# Altium footprint library Connectors_THT.PcbLib: 103 footprints (part 5 of 11)
Each footprint in its own frame and in the unit in brackets; x right, y up, seen from the top. Pads: shape width x height; smd on the part's side, far side on the other; paste and mask are expansions set on the pad; w line width, h text height; cw(c..) or ccw(c..) is an arc to the next point about the centre after c.
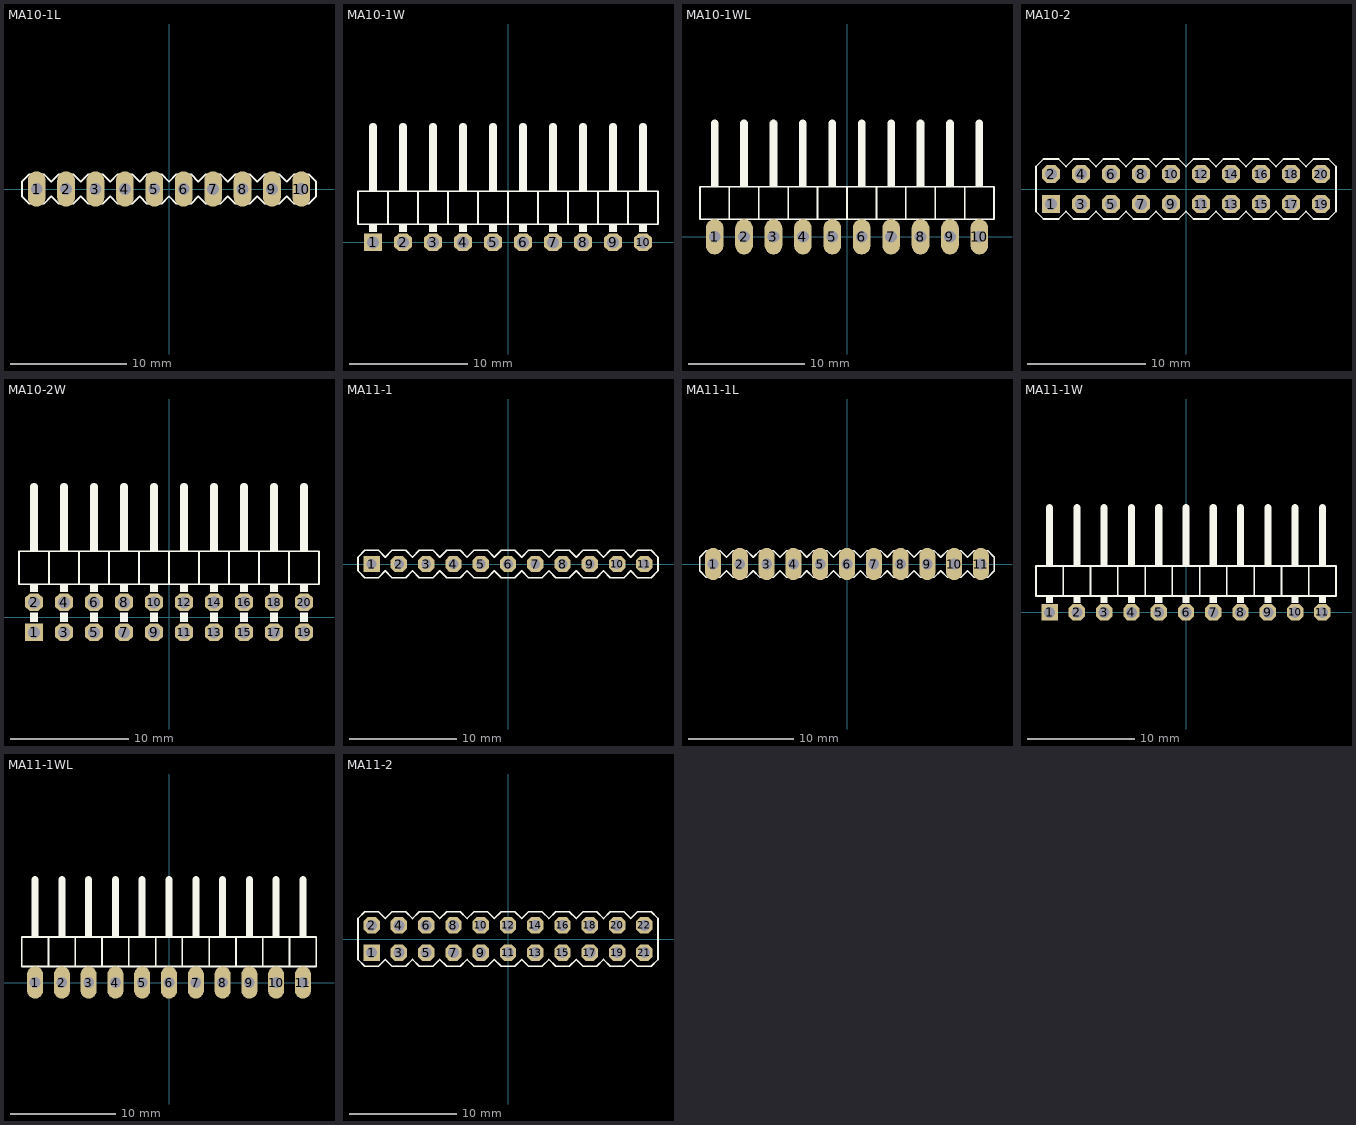
[diagram p4: the footprints below, top view; thin cyan lines are the x and y axes]

## MA10-1L [mil]
pads (10):
  oval 60x120 hole 40: 1(-450,0) 2(-350,0) 3(-250,0) 4(-150,0) 5(-50,0) 6(50,0) 7(150,0) 8(250,0) 9(350,0) 10(450,0)
Top Overlay:
  lines w6: -500,-25 -500,25 -475,50 -425,50 -400,25 -375,50 -325,50 -300,25 -275,50 -225,50 -200,25 -175,50 -125,50 -100,25 -75,50 -25,50 0,25 25,50 75,50 100,25 125,50 175,50 200,25 225,50 275,50 300,25 325,50 375,50 400,25 425,50 475,50 500,25 500,-25 475,-50 425,-50 400,-25 375,-50 325,-50 300,-25 275,-50 225,-50 200,-25 175,-50 125,-50 100,-25 75,-50 25,-50 0,-25 -25,-50 -75,-50 -100,-25 -125,-50 -175,-50 -200,-25 -225,-50 -275,-50 -300,-25 -325,-50 -375,-50 -400,-25 -425,-50 -475,-50 -500,-25
3D body: height 338.58, standoff 0, extent 437.51,-12.49 462.51,12.51
3D body: height 98.43, standoff 11.81, extent 400,-50 500,50
3D body: height 11.81, standoff 0, extent 400,-50 500,-25
3D body: height 11.81, standoff 0, extent 400,25 500,50
3D body: height 31.5, standoff 0, extent 437.5,-12.5 462.5,12.5
3D body: height 338.58, standoff 0, extent 337.51,-12.49 362.51,12.51
3D body: height 98.43, standoff 11.81, extent 300,-50 400,50
3D body: height 11.81, standoff 0, extent 300,-50 400,-25
3D body: height 11.81, standoff 0, extent 300,25 400,50
3D body: height 31.5, standoff 0, extent 337.5,-12.5 362.5,12.5
3D body: height 338.58, standoff 0, extent 237.51,-12.49 262.51,12.51
3D body: height 98.43, standoff 11.81, extent 200,-50 300,50
3D body: height 11.81, standoff 0, extent 200,-50 300,-25
3D body: height 11.81, standoff 0, extent 200,25 300,50
3D body: height 31.5, standoff 0, extent 237.5,-12.5 262.5,12.5
3D body: height 338.58, standoff 0, extent 137.51,-12.49 162.51,12.51
3D body: height 98.43, standoff 11.81, extent 100,-50 200,50
3D body: height 11.81, standoff 0, extent 100,-50 200,-25
3D body: height 11.81, standoff 0, extent 100,25 200,50
3D body: height 31.5, standoff 0, extent 137.5,-12.5 162.5,12.5
3D body: height 338.58, standoff 0, extent 37.51,-12.49 62.51,12.51
3D body: height 98.43, standoff 11.81, extent 0,-50 100,50
3D body: height 11.81, standoff 0, extent 0,-50 100,-25
3D body: height 11.81, standoff 0, extent 0,25 100,50
3D body: height 31.5, standoff 0, extent 37.5,-12.5 62.5,12.5
3D body: height 338.58, standoff 0, extent -62.49,-12.49 -37.49,12.51
3D body: height 98.43, standoff 11.81, extent -100,-50 0,50
3D body: height 11.81, standoff 0, extent -100,-50 0,-25
3D body: height 11.81, standoff 0, extent -100,25 0,50
3D body: height 31.5, standoff 0, extent -62.5,-12.5 -37.5,12.5
3D body: height 338.58, standoff 0, extent -162.49,-12.49 -137.49,12.51
3D body: height 98.43, standoff 11.81, extent -200,-50 -100,50
3D body: height 11.81, standoff 0, extent -200,-50 -100,-25
3D body: height 11.81, standoff 0, extent -200,25 -100,50
3D body: height 31.5, standoff 0, extent -162.5,-12.5 -137.5,12.5
3D body: height 338.58, standoff 0, extent -262.49,-12.49 -237.49,12.51
3D body: height 98.43, standoff 11.81, extent -300,-50 -200,50
3D body: height 11.81, standoff 0, extent -300,-50 -200,-25
3D body: height 11.81, standoff 0, extent -300,25 -200,50
3D body: height 31.5, standoff 0, extent -262.5,-12.5 -237.5,12.5
3D body: height 338.58, standoff 0, extent -362.49,-12.49 -337.49,12.51
3D body: height 98.43, standoff 11.81, extent -400,-50 -300,50
3D body: height 11.81, standoff 0, extent -400,-50 -300,-25
3D body: height 11.81, standoff 0, extent -400,25 -300,50
3D body: height 31.5, standoff 0, extent -362.5,-12.5 -337.5,12.5
3D body: height 338.58, standoff 0, extent -462.49,-12.49 -437.49,12.51
3D body: height 98.43, standoff 11.81, extent -500,-50 -400,50
3D body: height 11.81, standoff 0, extent -500,-50 -400,-25
3D body: height 11.81, standoff 0, extent -500,25 -400,50
3D body: height 31.5, standoff 0, extent -462.5,-12.5 -437.5,12.5

## MA10-1W [mil]
pads (10):
  rect 60x60 hole 40: 1(-450,0)
  oct 60x60 hole 40: 2(-350,0) 3(-250,0) 4(-150,0) 5(-50,0) 6(50,0) 7(150,0) 8(250,0) 9(350,0) 10(450,0)
Top Overlay:
  rectangle: -463,34 -437,60
  rectangle: -363,34 -337,60
  rectangle: -263,34 -237,60
  rectangle: -163,34 -137,60
  rectangle: -63,34 -37,60
  rectangle: 37,34 63,60
  rectangle: 137,34 163,60
  rectangle: 237,34 263,60
  rectangle: 337,34 363,60
  rectangle: 437,34 463,60
  rectangle: -63,170 -37,200
  rectangle: -163,170 -137,200
  rectangle: -263,170 -237,200
  rectangle: -363,170 -337,200
  rectangle: -463,170 -437,200
  rectangle: 437,170 463,200
  rectangle: 337,170 363,200
  rectangle: 237,170 263,200
  rectangle: 137,170 163,200
  rectangle: 37,170 63,200
  lines w6: -400,60 -300,60 ; -400,60 -500,60 -500,170 -400,170 ; -400,60 -400,170 ; -400,170 -300,170 ; -300,60 -300,170 ; -300,60 -200,60 ; -300,170 -200,170 ; -200,60 -200,170 ; -200,60 -100,60 ; -200,170 -100,170 ; -100,60 -100,170 ; -100,60 0,60 ; -100,170 0,170 ; 0,60 0,170 ; 0,60 100,60 ; 0,170 100,170 ; 100,60 200,60 ; 100,60 100,170 ; 100,170 200,170 ; 200,60 200,170 ; 200,60 300,60 ; 200,170 300,170 ; 300,60 300,170 ; 300,60 400,60 ; 300,170 400,170 ; 400,60 400,170 ; 400,60 500,60 500,170 400,170
  lines w26: -450,200 -450,385 ; -350,200 -350,385 ; -250,200 -250,385 ; -150,200 -150,385 ; -50,200 -50,385 ; 50,200 50,385 ; 150,200 150,385 ; 250,200 250,385 ; 350,200 350,385 ; 450,200 450,385
3D body: height 62.48, standoff 0, extent 437.51,-12.49 462.51,12.51
3D body: height 100, standoff 0, extent 400,60 500,170
3D body: height 62.5, standoff 37.5, extent 437.51,-12.49 462.51,393.76
3D body: height 62.48, standoff 0, extent 337.51,-12.49 362.51,12.51
3D body: height 100, standoff 0, extent 300,60 400,170
3D body: height 62.5, standoff 37.5, extent 337.51,-12.49 362.51,393.76
3D body: height 62.48, standoff 0, extent 237.51,-12.49 262.51,12.51
3D body: height 100, standoff 0, extent 200,60 300,170
3D body: height 62.5, standoff 37.5, extent 237.51,-12.49 262.51,393.76
3D body: height 62.48, standoff 0, extent 137.51,-12.49 162.51,12.51
3D body: height 100, standoff 0, extent 100,60 200,170
3D body: height 62.5, standoff 37.5, extent 137.51,-12.49 162.51,393.76
3D body: height 62.5, standoff 37.5, extent 37.5,-12.49 62.5,393.75
3D body: height 100, standoff 0, extent 0,60 100,170
3D body: height 62.48, standoff 0, extent 37.51,-12.49 62.51,12.51
3D body: height 31.5, standoff 0, extent 37.51,-12.49 62.51,12.51
3D body: height 31.5, standoff 0, extent 137.51,-12.49 162.51,12.51
3D body: height 31.5, standoff 0, extent 237.51,-12.49 262.51,12.51
3D body: height 31.5, standoff 0, extent 337.51,-12.49 362.51,12.51
3D body: height 31.5, standoff 0, extent 437.51,-12.49 462.51,12.51
3D body: height 62.48, standoff 0, extent -62.49,-12.49 -37.49,12.51
3D body: height 100, standoff 0, extent -100,60 0,170
3D body: height 62.5, standoff 37.5, extent -62.49,-12.49 -37.49,393.76
3D body: height 62.48, standoff 0, extent -162.49,-12.49 -137.49,12.51
3D body: height 100, standoff 0, extent -200,60 -100,170
3D body: height 62.5, standoff 37.5, extent -162.49,-12.49 -137.49,393.76
3D body: height 62.48, standoff 0, extent -262.49,-12.49 -237.49,12.51
3D body: height 100, standoff 0, extent -300,60 -200,170
3D body: height 62.5, standoff 37.5, extent -262.49,-12.49 -237.49,393.76
3D body: height 62.48, standoff 0, extent -362.49,-12.49 -337.49,12.51
3D body: height 100, standoff 0, extent -400,60 -300,170
3D body: height 62.5, standoff 37.5, extent -362.49,-12.49 -337.49,393.76
3D body: height 62.5, standoff 37.5, extent -462.5,-12.49 -437.5,393.75
3D body: height 100, standoff 0, extent -500,60 -400,170
3D body: height 62.48, standoff 0, extent -462.49,-12.49 -437.49,12.51
3D body: height 31.5, standoff 0, extent -462.49,-12.49 -437.49,12.51
3D body: height 31.5, standoff 0, extent -362.49,-12.49 -337.49,12.51
3D body: height 31.5, standoff 0, extent -262.49,-12.49 -237.49,12.51
3D body: height 31.5, standoff 0, extent -162.49,-12.49 -137.49,12.51
3D body: height 31.5, standoff 0, extent -62.49,-12.49 -37.49,12.51

## MA10-1WL [mil]
pads (10):
  oval 60x120 hole 40: 1(-450,0) 2(-350,0) 3(-250,0) 4(-150,0) 5(-50,0) 6(50,0) 7(150,0) 8(250,0) 9(350,0) 10(450,0)
Top Overlay:
  rectangle: -463,34 -437,60
  rectangle: -363,34 -337,60
  rectangle: -263,34 -237,60
  rectangle: -163,34 -137,60
  rectangle: -63,34 -37,60
  rectangle: 37,34 63,60
  rectangle: 137,34 163,60
  rectangle: 237,34 263,60
  rectangle: 337,34 363,60
  rectangle: 437,34 463,60
  rectangle: -63,170 -37,200
  rectangle: -163,170 -137,200
  rectangle: -263,170 -237,200
  rectangle: -363,170 -337,200
  rectangle: -463,170 -437,200
  rectangle: 437,170 463,200
  rectangle: 337,170 363,200
  rectangle: 237,170 263,200
  rectangle: 137,170 163,200
  rectangle: 37,170 63,200
  lines w6: -400,60 -300,60 ; -400,60 -500,60 -500,170 -400,170 ; -400,60 -400,170 ; -400,170 -300,170 ; -300,60 -300,170 ; -300,60 -200,60 ; -300,170 -200,170 ; -200,60 -200,170 ; -200,60 -100,60 ; -200,170 -100,170 ; -100,60 -100,170 ; -100,60 0,60 ; -100,170 0,170 ; 0,60 0,170 ; 0,60 100,60 ; 0,170 100,170 ; 100,60 200,60 ; 100,60 100,170 ; 100,170 200,170 ; 200,60 200,170 ; 200,60 300,60 ; 200,170 300,170 ; 300,60 300,170 ; 300,60 400,60 ; 300,170 400,170 ; 400,60 400,170 ; 400,60 500,60 500,170 400,170
  lines w26: -450,200 -450,385 ; -350,200 -350,385 ; -250,200 -250,385 ; -150,200 -150,385 ; -50,200 -50,385 ; 50,200 50,385 ; 150,200 150,385 ; 250,200 250,385 ; 350,200 350,385 ; 450,200 450,385
3D body: height 62.48, standoff 0, extent 437.51,-12.49 462.51,12.51
3D body: height 100, standoff 0, extent 400,60 500,170
3D body: height 62.5, standoff 37.5, extent 437.51,-12.49 462.51,393.76
3D body: height 62.48, standoff 0, extent 337.51,-12.49 362.51,12.51
3D body: height 100, standoff 0, extent 300,60 400,170
3D body: height 62.5, standoff 37.5, extent 337.51,-12.49 362.51,393.76
3D body: height 62.48, standoff 0, extent 237.51,-12.49 262.51,12.51
3D body: height 100, standoff 0, extent 200,60 300,170
3D body: height 62.5, standoff 37.5, extent 237.51,-12.49 262.51,393.76
3D body: height 62.48, standoff 0, extent 137.51,-12.49 162.51,12.51
3D body: height 100, standoff 0, extent 100,60 200,170
3D body: height 62.5, standoff 37.5, extent 137.51,-12.49 162.51,393.76
3D body: height 62.5, standoff 37.5, extent 37.5,-12.49 62.5,393.75
3D body: height 100, standoff 0, extent 0,60 100,170
3D body: height 62.48, standoff 0, extent 37.51,-12.49 62.51,12.51
3D body: height 31.5, standoff 0, extent 37.51,-12.49 62.51,12.51
3D body: height 31.5, standoff 0, extent 137.51,-12.49 162.51,12.51
3D body: height 31.5, standoff 0, extent 237.51,-12.49 262.51,12.51
3D body: height 31.5, standoff 0, extent 337.51,-12.49 362.51,12.51
3D body: height 31.5, standoff 0, extent 437.51,-12.49 462.51,12.51
3D body: height 62.48, standoff 0, extent -62.49,-12.49 -37.49,12.51
3D body: height 100, standoff 0, extent -100,60 0,170
3D body: height 62.5, standoff 37.5, extent -62.49,-12.49 -37.49,393.76
3D body: height 62.48, standoff 0, extent -162.49,-12.49 -137.49,12.51
3D body: height 100, standoff 0, extent -200,60 -100,170
3D body: height 62.5, standoff 37.5, extent -162.49,-12.49 -137.49,393.76
3D body: height 62.48, standoff 0, extent -262.49,-12.49 -237.49,12.51
3D body: height 100, standoff 0, extent -300,60 -200,170
3D body: height 62.5, standoff 37.5, extent -262.49,-12.49 -237.49,393.76
3D body: height 62.48, standoff 0, extent -362.49,-12.49 -337.49,12.51
3D body: height 100, standoff 0, extent -400,60 -300,170
3D body: height 62.5, standoff 37.5, extent -362.49,-12.49 -337.49,393.76
3D body: height 62.5, standoff 37.5, extent -462.5,-12.49 -437.5,393.75
3D body: height 100, standoff 0, extent -500,60 -400,170
3D body: height 62.48, standoff 0, extent -462.49,-12.49 -437.49,12.51
3D body: height 31.5, standoff 0, extent -462.49,-12.49 -437.49,12.51
3D body: height 31.5, standoff 0, extent -362.49,-12.49 -337.49,12.51
3D body: height 31.5, standoff 0, extent -262.49,-12.49 -237.49,12.51
3D body: height 31.5, standoff 0, extent -162.49,-12.49 -137.49,12.51
3D body: height 31.5, standoff 0, extent -62.49,-12.49 -37.49,12.51

## MA10-2 [mil]
pads (20):
  rect 60x60 hole 40: 1(-450,-50)
  oct 60x60 hole 40: 2(-450,50) 3(-350,-50) 4(-350,50) 5(-250,-50) 6(-250,50) 7(-150,-50) 8(-150,50) 9(-50,-50) 10(-50,50) 11(50,-50) 12(50,50) 13(150,-50) 14(150,50) 15(250,-50) 16(250,50) 17(350,-50) 18(350,50) 19(450,-50) 20(450,50)
Top Overlay:
  lines w6: -500,-75 -475,-100 -425,-100 -400,-75 -375,-100 -325,-100 -300,-75 -275,-100 -225,-100 -200,-75 -175,-100 -125,-100 -100,-75 -75,-100 -25,-100 0,-75 25,-100 75,-100 100,-75 125,-100 175,-100 200,-75 225,-100 275,-100 300,-75 325,-100 375,-100 400,-75 425,-100 475,-100 500,-75 500,75 475,100 425,100 400,75 375,100 325,100 300,75 275,100 225,100 200,75 175,100 125,100 100,75 75,100 25,100 0,75 -25,100 -75,100 -100,75 -125,100 -175,100 -200,75 -225,100 -275,100 -300,75 -325,100 -375,100 -400,75 -425,100 -475,100 -500,75 -500,-75
3D body: height 31.5, standoff 0, extent -462.49,-62.49 -437.49,-37.49
3D body: height 338.58, standoff 0, extent -462.49,37.51 -437.49,62.51
3D body: height 98.43, standoff 11.81, extent -500,-100 -400,100
3D body: height 11.81, standoff 0, extent -500,75 -400,100
3D body: height 11.81, standoff 0, extent -500,-100 -400,-75
3D body: height 338.58, standoff 0, extent -462.49,-62.49 -437.49,-37.49
3D body: height 31.5, standoff 0, extent -462.49,37.51 -437.49,62.51
3D body: height 31.5, standoff 0, extent -362.49,-62.49 -337.49,-37.49
3D body: height 338.58, standoff 0, extent -362.49,37.51 -337.49,62.51
3D body: height 98.43, standoff 11.81, extent -400,-100 -300,100
3D body: height 11.81, standoff 0, extent -400,75 -300,100
3D body: height 11.81, standoff 0, extent -400,-100 -300,-75
3D body: height 338.58, standoff 0, extent -362.49,-62.49 -337.49,-37.49
3D body: height 31.5, standoff 0, extent -362.49,37.51 -337.49,62.51
3D body: height 31.5, standoff 0, extent -262.49,-62.49 -237.49,-37.49
3D body: height 338.58, standoff 0, extent -262.49,37.51 -237.49,62.51
3D body: height 98.43, standoff 11.81, extent -300,-100 -200,100
3D body: height 11.81, standoff 0, extent -300,75 -200,100
3D body: height 11.81, standoff 0, extent -300,-100 -200,-75
3D body: height 338.58, standoff 0, extent -262.49,-62.49 -237.49,-37.49
3D body: height 31.5, standoff 0, extent -262.49,37.51 -237.49,62.51
3D body: height 31.5, standoff 0, extent -162.49,-62.49 -137.49,-37.49
3D body: height 338.58, standoff 0, extent -162.49,37.51 -137.49,62.51
3D body: height 98.43, standoff 11.81, extent -200,-100 -100,100
3D body: height 11.81, standoff 0, extent -200,75 -100,100
3D body: height 11.81, standoff 0, extent -200,-100 -100,-75
3D body: height 338.58, standoff 0, extent -162.49,-62.49 -137.49,-37.49
3D body: height 31.5, standoff 0, extent -162.49,37.51 -137.49,62.51
3D body: height 31.5, standoff 0, extent -62.49,-62.49 -37.49,-37.49
3D body: height 338.58, standoff 0, extent -62.49,37.51 -37.49,62.51
3D body: height 98.43, standoff 11.81, extent -100,-100 0,100
3D body: height 11.81, standoff 0, extent -100,75 0,100
3D body: height 11.81, standoff 0, extent -100,-100 0,-75
3D body: height 338.58, standoff 0, extent -62.49,-62.49 -37.49,-37.49
3D body: height 31.5, standoff 0, extent -62.49,37.51 -37.49,62.51
3D body: height 31.5, standoff 0, extent 37.51,-62.49 62.51,-37.49
3D body: height 338.58, standoff 0, extent 37.51,37.51 62.51,62.51
3D body: height 98.43, standoff 11.81, extent 0,-100 100,100
3D body: height 11.81, standoff 0, extent 0,75 100,100
3D body: height 11.81, standoff 0, extent 0,-100 100,-75
3D body: height 338.58, standoff 0, extent 37.51,-62.49 62.51,-37.49
3D body: height 31.5, standoff 0, extent 37.51,37.51 62.51,62.51
3D body: height 31.5, standoff 0, extent 137.51,-62.49 162.51,-37.49
3D body: height 338.58, standoff 0, extent 137.51,37.51 162.51,62.51
3D body: height 98.43, standoff 11.81, extent 100,-100 200,100
3D body: height 11.81, standoff 0, extent 100,75 200,100
3D body: height 11.81, standoff 0, extent 100,-100 200,-75
3D body: height 338.58, standoff 0, extent 137.51,-62.49 162.51,-37.49
3D body: height 31.5, standoff 0, extent 137.51,37.51 162.51,62.51
3D body: height 31.5, standoff 0, extent 237.51,-62.49 262.51,-37.49
3D body: height 338.58, standoff 0, extent 237.51,37.51 262.51,62.51
3D body: height 98.43, standoff 11.81, extent 200,-100 300,100
3D body: height 11.81, standoff 0, extent 200,75 300,100
3D body: height 11.81, standoff 0, extent 200,-100 300,-75
3D body: height 338.58, standoff 0, extent 237.51,-62.49 262.51,-37.49
3D body: height 31.5, standoff 0, extent 237.51,37.51 262.51,62.51
3D body: height 31.5, standoff 0, extent 337.51,-62.49 362.51,-37.49
3D body: height 338.58, standoff 0, extent 337.51,37.51 362.51,62.51
3D body: height 98.43, standoff 11.81, extent 300,-100 400,100
3D body: height 11.81, standoff 0, extent 300,75 400,100
3D body: height 11.81, standoff 0, extent 300,-100 400,-75
3D body: height 338.58, standoff 0, extent 337.51,-62.49 362.51,-37.49
3D body: height 31.5, standoff 0, extent 337.51,37.51 362.51,62.51
3D body: height 31.5, standoff 0, extent 437.51,-62.49 462.51,-37.49
3D body: height 338.58, standoff 0, extent 437.51,37.51 462.51,62.51
3D body: height 98.43, standoff 11.81, extent 400,-100 500,100
3D body: height 11.81, standoff 0, extent 400,75 500,100
3D body: height 11.81, standoff 0, extent 400,-100 500,-75
3D body: height 338.58, standoff 0, extent 437.51,-62.49 462.51,-37.49
3D body: height 31.5, standoff 0, extent 437.51,37.51 462.51,62.51

## MA10-2W [mil]
pads (20):
  rect 60x60 hole 40: 1(-450,-50)
  oct 60x60 hole 40: 2(-450,50) 3(-350,-50) 4(-350,50) 5(-250,-50) 6(-250,50) 7(-150,-50) 8(-150,50) 9(-50,-50) 10(-50,50) 11(50,-50) 12(50,50) 13(150,-50) 14(150,50) 15(250,-50) 16(250,50) 17(350,-50) 18(350,50) 19(450,-50) 20(450,50)
Top Overlay:
  rectangle: 437,-16 463,16
  rectangle: 337,-16 363,16
  rectangle: 237,-16 263,16
  rectangle: 137,-16 163,16
  rectangle: 37,-16 63,16
  rectangle: -63,-16 -37,16
  rectangle: -163,-16 -137,16
  rectangle: -263,-16 -237,16
  rectangle: -363,-16 -337,16
  rectangle: -463,-16 -437,16
  rectangle: -463,84 -437,110
  rectangle: -363,84 -337,110
  rectangle: -263,84 -237,110
  rectangle: -163,84 -137,110
  rectangle: -63,84 -37,110
  rectangle: 37,84 63,110
  rectangle: 137,84 163,110
  rectangle: 237,84 263,110
  rectangle: 337,84 363,110
  rectangle: 437,84 463,110
  rectangle: -63,220 -37,250
  rectangle: -163,220 -137,250
  rectangle: -263,220 -237,250
  rectangle: -363,220 -337,250
  rectangle: -463,220 -437,250
  rectangle: 437,220 463,250
  rectangle: 337,220 363,250
  rectangle: 237,220 263,250
  rectangle: 137,220 163,250
  rectangle: 37,220 63,250
  lines w6: -400,110 -300,110 ; -400,110 -500,110 -500,220 -400,220 ; -400,110 -400,220 ; -400,220 -300,220 ; -300,110 -300,220 ; -300,110 -200,110 ; -300,220 -200,220 ; -200,110 -200,220 ; -200,110 -100,110 ; -200,220 -100,220 ; -100,110 -100,220 ; -100,110 0,110 ; -100,220 0,220 ; 0,110 0,220 ; 0,110 100,110 ; 0,220 100,220 ; 100,110 200,110 ; 100,110 100,220 ; 100,220 200,220 ; 200,110 200,220 ; 200,110 300,110 ; 200,220 300,220 ; 300,110 300,220 ; 300,110 400,110 ; 300,220 400,220 ; 400,110 400,220 ; 400,110 500,110 500,220 400,220
  lines w26: -450,250 -450,435 ; -350,250 -350,435 ; -250,250 -250,435 ; -150,250 -150,435 ; -50,250 -50,435 ; 50,250 50,435 ; 150,250 150,435 ; 250,250 250,435 ; 350,250 350,435 ; 450,250 450,435
3D body: height 31.5, standoff 0, extent -62.49,-62.49 -37.49,-37.49
3D body: height 31.5, standoff 0, extent -62.49,37.51 -37.49,62.51
3D body: height 31.5, standoff 0, extent -162.49,-62.49 -137.49,-37.49
3D body: height 31.5, standoff 0, extent -162.49,37.51 -137.49,62.51
3D body: height 31.5, standoff 0, extent -262.49,37.51 -237.49,62.51
3D body: height 31.5, standoff 0, extent -262.49,-62.49 -237.49,-37.49
3D body: height 31.5, standoff 0, extent -362.49,-62.49 -337.49,-37.49
3D body: height 31.5, standoff 0, extent -362.49,37.51 -337.49,62.51
3D body: height 31.5, standoff 0, extent -462.5,-62.5 -437.5,-37.5
3D body: height 31.5, standoff 0, extent -462.49,37.5 -437.49,62.5
3D body: height 162.48, standoff 137.52, extent -462.5,-62.5 -437.5,443.75
3D body: height 162.48, standoff 0, extent -462.5,-62.5 -437.5,-37.5
3D body: height 62.48, standoff 0, extent -462.49,37.51 -437.49,62.51
3D body: height 200, standoff 0, extent -500,110 -400,220
3D body: height 62.5, standoff 37.5, extent -462.5,37.51 -437.5,443.75
3D body: height 62.5, standoff 37.5, extent -362.49,37.51 -337.49,443.76
3D body: height 200, standoff 0, extent -400,110 -300,220
3D body: height 62.48, standoff 0, extent -362.49,37.51 -337.49,62.51
3D body: height 162.48, standoff 0, extent -362.49,-62.49 -337.49,-37.49
3D body: height 162.48, standoff 137.52, extent -362.5,-62.49 -337.5,443.76
3D body: height 62.5, standoff 37.5, extent -262.49,37.51 -237.49,443.76
3D body: height 200, standoff 0, extent -300,110 -200,220
3D body: height 62.48, standoff 0, extent -262.49,37.51 -237.49,62.51
3D body: height 162.48, standoff 0, extent -262.49,-62.49 -237.49,-37.49
3D body: height 162.48, standoff 137.52, extent -262.5,-62.49 -237.5,443.76
3D body: height 62.5, standoff 37.5, extent -162.49,37.51 -137.49,443.76
3D body: height 200, standoff 0, extent -200,110 -100,220
3D body: height 62.48, standoff 0, extent -162.49,37.51 -137.49,62.51
3D body: height 162.48, standoff 0, extent -162.49,-62.49 -137.49,-37.49
3D body: height 162.48, standoff 137.52, extent -162.5,-62.49 -137.5,443.76
3D body: height 62.5, standoff 37.5, extent -62.49,37.51 -37.49,443.76
3D body: height 200, standoff 0, extent -100,110 0,220
3D body: height 62.48, standoff 0, extent -62.49,37.51 -37.49,62.51
3D body: height 162.48, standoff 0, extent -62.49,-62.49 -37.49,-37.49
3D body: height 162.48, standoff 137.52, extent -62.5,-62.49 -37.5,443.76
3D body: height 31.5, standoff 0, extent 437.51,-62.49 462.51,-37.49
3D body: height 31.5, standoff 0, extent 437.51,37.51 462.51,62.51
3D body: height 31.5, standoff 0, extent 337.51,-62.49 362.51,-37.49
3D body: height 31.5, standoff 0, extent 337.51,37.51 362.51,62.51
3D body: height 31.5, standoff 0, extent 237.51,37.51 262.51,62.51
3D body: height 31.5, standoff 0, extent 237.51,-62.49 262.51,-37.49
3D body: height 31.5, standoff 0, extent 137.51,-62.49 162.51,-37.49
3D body: height 31.5, standoff 0, extent 137.51,37.51 162.51,62.51
3D body: height 31.5, standoff 0, extent 37.5,-62.5 62.5,-37.5
3D body: height 31.5, standoff 0, extent 37.51,37.5 62.51,62.5
3D body: height 162.48, standoff 137.52, extent 37.5,-62.5 62.5,443.75
3D body: height 162.48, standoff 0, extent 37.5,-62.5 62.5,-37.5
3D body: height 62.48, standoff 0, extent 37.51,37.51 62.51,62.51
3D body: height 200, standoff 0, extent 0,110 100,220
3D body: height 62.5, standoff 37.5, extent 37.5,37.51 62.5,443.75
3D body: height 62.5, standoff 37.5, extent 137.51,37.51 162.51,443.76
3D body: height 200, standoff 0, extent 100,110 200,220
3D body: height 62.48, standoff 0, extent 137.51,37.51 162.51,62.51
3D body: height 162.48, standoff 0, extent 137.51,-62.49 162.51,-37.49
3D body: height 162.48, standoff 137.52, extent 137.5,-62.49 162.5,443.76
3D body: height 62.5, standoff 37.5, extent 237.51,37.51 262.51,443.76
3D body: height 200, standoff 0, extent 200,110 300,220
3D body: height 62.48, standoff 0, extent 237.51,37.51 262.51,62.51
3D body: height 162.48, standoff 0, extent 237.51,-62.49 262.51,-37.49
3D body: height 162.48, standoff 137.52, extent 237.5,-62.49 262.5,443.76
3D body: height 62.5, standoff 37.5, extent 337.51,37.51 362.51,443.76
3D body: height 200, standoff 0, extent 300,110 400,220
3D body: height 62.48, standoff 0, extent 337.51,37.51 362.51,62.51
3D body: height 162.48, standoff 0, extent 337.51,-62.49 362.51,-37.49
3D body: height 162.48, standoff 137.52, extent 337.5,-62.49 362.5,443.76
3D body: height 62.5, standoff 37.5, extent 437.51,37.51 462.51,443.76
3D body: height 200, standoff 0, extent 400,110 500,220
3D body: height 62.48, standoff 0, extent 437.51,37.51 462.51,62.51
3D body: height 162.48, standoff 0, extent 437.51,-62.49 462.51,-37.49
3D body: height 162.48, standoff 137.52, extent 437.5,-62.49 462.5,443.76

## MA11-1 [mil]
pads (11):
  rect 60x60 hole 36: 1(-500,0)
  oct 60x60 hole 36: 2(-400,0) 3(-300,0) 4(-200,0) 5(-100,0) 6(0,0) 7(100,0) 8(200,0) 9(300,0) 10(400,0) 11(500,0)
Top Overlay:
  lines w6: -550,-25 -550,25 -525,50 -475,50 -450,25 -425,50 -375,50 -350,25 -325,50 -275,50 -250,25 -225,50 -175,50 -150,25 -125,50 -75,50 -50,25 -25,50 25,50 50,25 75,50 125,50 150,25 175,50 225,50 250,25 275,50 325,50 350,25 375,50 425,50 450,25 475,50 525,50 550,25 550,-25 525,-50 475,-50 450,-25 425,-50 375,-50 350,-25 325,-50 275,-50 250,-25 225,-50 175,-50 150,-25 125,-50 75,-50 50,-25 25,-50 -25,-50 -50,-25 -75,-50 -125,-50 -150,-25 -175,-50 -225,-50 -250,-25 -275,-50 -325,-50 -350,-25 -375,-50 -425,-50 -450,-25 -475,-50 -525,-50 -550,-25
3D body: height 31.5, standoff 0, extent -512.5,-12.5 -487.5,12.5
3D body: height 11.81, standoff 0, extent -550,25 -450,50
3D body: height 11.81, standoff 0, extent -550,-50 -450,-25
3D body: height 98.43, standoff 11.81, extent -550,-50 -450,50
3D body: height 338.58, standoff 0, extent -512.5,-12.5 -487.5,12.5
3D body: height 31.5, standoff 0, extent -412.5,-12.5 -387.5,12.5
3D body: height 11.81, standoff 0, extent -450,25 -350,50
3D body: height 11.81, standoff 0, extent -450,-50 -350,-25
3D body: height 98.43, standoff 11.81, extent -450,-50 -350,50
3D body: height 338.58, standoff 0, extent -412.5,-12.5 -387.5,12.5
3D body: height 31.5, standoff 0, extent -312.5,-12.5 -287.5,12.5
3D body: height 11.81, standoff 0, extent -350,25 -250,50
3D body: height 11.81, standoff 0, extent -350,-50 -250,-25
3D body: height 98.43, standoff 11.81, extent -350,-50 -250,50
3D body: height 338.58, standoff 0, extent -312.5,-12.5 -287.5,12.5
3D body: height 31.5, standoff 0, extent -212.5,-12.5 -187.5,12.5
3D body: height 11.81, standoff 0, extent -250,25 -150,50
3D body: height 11.81, standoff 0, extent -250,-50 -150,-25
3D body: height 98.43, standoff 11.81, extent -250,-50 -150,50
3D body: height 338.58, standoff 0, extent -212.5,-12.5 -187.5,12.5
3D body: height 31.5, standoff 0, extent -112.5,-12.5 -87.5,12.5
3D body: height 11.81, standoff 0, extent -150,25 -50,50
3D body: height 11.81, standoff 0, extent -150,-50 -50,-25
3D body: height 98.43, standoff 11.81, extent -150,-50 -50,50
3D body: height 338.58, standoff 0, extent -112.5,-12.5 -87.5,12.5
3D body: height 31.5, standoff 0, extent -12.5,-12.5 12.5,12.5
3D body: height 11.81, standoff 0, extent -50,25 50,50
3D body: height 11.81, standoff 0, extent -50,-50 50,-25
3D body: height 98.43, standoff 11.81, extent -50,-50 50,50
3D body: height 338.58, standoff 0, extent -12.5,-12.5 12.5,12.5
3D body: height 31.5, standoff 0, extent 87.5,-12.5 112.5,12.5
3D body: height 11.81, standoff 0, extent 50,25 150,50
3D body: height 11.81, standoff 0, extent 50,-50 150,-25
3D body: height 98.43, standoff 11.81, extent 50,-50 150,50
3D body: height 338.58, standoff 0, extent 87.5,-12.5 112.5,12.5
3D body: height 31.5, standoff 0, extent 187.5,-12.5 212.5,12.5
3D body: height 11.81, standoff 0, extent 150,25 250,50
3D body: height 11.81, standoff 0, extent 150,-50 250,-25
3D body: height 98.43, standoff 11.81, extent 150,-50 250,50
3D body: height 338.58, standoff 0, extent 187.5,-12.5 212.5,12.5
3D body: height 31.5, standoff 0, extent 287.5,-12.5 312.5,12.5
3D body: height 11.81, standoff 0, extent 250,25 350,50
3D body: height 11.81, standoff 0, extent 250,-50 350,-25
3D body: height 98.43, standoff 11.81, extent 250,-50 350,50
3D body: height 338.58, standoff 0, extent 287.5,-12.5 312.5,12.5
3D body: height 31.5, standoff 0, extent 387.5,-12.5 412.5,12.5
3D body: height 11.81, standoff 0, extent 350,25 450,50
3D body: height 11.81, standoff 0, extent 350,-50 450,-25
3D body: height 98.43, standoff 11.81, extent 350,-50 450,50
3D body: height 338.58, standoff 0, extent 387.5,-12.5 412.5,12.5
3D body: height 31.5, standoff 0, extent 487.5,-12.5 512.5,12.5
3D body: height 11.81, standoff 0, extent 450,25 550,50
3D body: height 11.81, standoff 0, extent 450,-50 550,-25
3D body: height 98.43, standoff 11.81, extent 450,-50 550,50
3D body: height 338.58, standoff 0, extent 487.5,-12.5 512.5,12.5

## MA11-1L [mil]
pads (11):
  oval 60x120 hole 40: 1(-500,0) 2(-400,0) 3(-300,0) 4(-200,0) 5(-100,0) 6(0,0) 7(100,0) 8(200,0) 9(300,0) 10(400,0) 11(500,0)
Top Overlay:
  lines w6: -550,-25 -550,25 -525,50 -475,50 -450,25 -425,50 -375,50 -350,25 -325,50 -275,50 -250,25 -225,50 -175,50 -150,25 -125,50 -75,50 -50,25 -25,50 25,50 50,25 75,50 125,50 150,25 175,50 225,50 250,25 275,50 325,50 350,25 375,50 425,50 450,25 475,50 525,50 550,25 550,-25 525,-50 475,-50 450,-25 425,-50 375,-50 350,-25 325,-50 275,-50 250,-25 225,-50 175,-50 150,-25 125,-50 75,-50 50,-25 25,-50 -25,-50 -50,-25 -75,-50 -125,-50 -150,-25 -175,-50 -225,-50 -250,-25 -275,-50 -325,-50 -350,-25 -375,-50 -425,-50 -450,-25 -475,-50 -525,-50 -550,-25
3D body: height 338.58, standoff 0, extent 487.51,-12.49 512.51,12.51
3D body: height 98.43, standoff 11.81, extent 450,-50 550,50
3D body: height 11.81, standoff 0, extent 450,-50 550,-25
3D body: height 11.81, standoff 0, extent 450,25 550,50
3D body: height 31.5, standoff 0, extent 487.5,-12.5 512.5,12.5
3D body: height 338.58, standoff 0, extent 387.51,-12.49 412.51,12.51
3D body: height 98.43, standoff 11.81, extent 350,-50 450,50
3D body: height 11.81, standoff 0, extent 350,-50 450,-25
3D body: height 11.81, standoff 0, extent 350,25 450,50
3D body: height 31.5, standoff 0, extent 387.5,-12.5 412.5,12.5
3D body: height 338.58, standoff 0, extent 287.51,-12.49 312.51,12.51
3D body: height 98.43, standoff 11.81, extent 250,-50 350,50
3D body: height 11.81, standoff 0, extent 250,-50 350,-25
3D body: height 11.81, standoff 0, extent 250,25 350,50
3D body: height 31.5, standoff 0, extent 287.5,-12.5 312.5,12.5
3D body: height 338.58, standoff 0, extent 187.51,-12.49 212.51,12.51
3D body: height 98.43, standoff 11.81, extent 150,-50 250,50
3D body: height 11.81, standoff 0, extent 150,-50 250,-25
3D body: height 11.81, standoff 0, extent 150,25 250,50
3D body: height 31.5, standoff 0, extent 187.5,-12.5 212.5,12.5
3D body: height 338.58, standoff 0, extent 87.51,-12.49 112.51,12.51
3D body: height 98.43, standoff 11.81, extent 50,-50 150,50
3D body: height 11.81, standoff 0, extent 50,-50 150,-25
3D body: height 11.81, standoff 0, extent 50,25 150,50
3D body: height 31.5, standoff 0, extent 87.5,-12.5 112.5,12.5
3D body: height 338.58, standoff 0, extent -12.49,-12.49 12.51,12.51
3D body: height 98.43, standoff 11.81, extent -50,-50 50,50
3D body: height 11.81, standoff 0, extent -50,-50 50,-25
3D body: height 11.81, standoff 0, extent -50,25 50,50
3D body: height 31.5, standoff 0, extent -12.5,-12.5 12.5,12.5
3D body: height 338.58, standoff 0, extent -112.49,-12.49 -87.49,12.51
3D body: height 98.43, standoff 11.81, extent -150,-50 -50,50
3D body: height 11.81, standoff 0, extent -150,-50 -50,-25
3D body: height 11.81, standoff 0, extent -150,25 -50,50
3D body: height 31.5, standoff 0, extent -112.5,-12.5 -87.5,12.5
3D body: height 338.58, standoff 0, extent -212.49,-12.49 -187.49,12.51
3D body: height 98.43, standoff 11.81, extent -250,-50 -150,50
3D body: height 11.81, standoff 0, extent -250,-50 -150,-25
3D body: height 11.81, standoff 0, extent -250,25 -150,50
3D body: height 31.5, standoff 0, extent -212.5,-12.5 -187.5,12.5
3D body: height 338.58, standoff 0, extent -312.49,-12.49 -287.49,12.51
3D body: height 98.43, standoff 11.81, extent -350,-50 -250,50
3D body: height 11.81, standoff 0, extent -350,-50 -250,-25
3D body: height 11.81, standoff 0, extent -350,25 -250,50
3D body: height 31.5, standoff 0, extent -312.5,-12.5 -287.5,12.5
3D body: height 338.58, standoff 0, extent -412.49,-12.49 -387.49,12.51
3D body: height 98.43, standoff 11.81, extent -450,-50 -350,50
3D body: height 11.81, standoff 0, extent -450,-50 -350,-25
3D body: height 11.81, standoff 0, extent -450,25 -350,50
3D body: height 31.5, standoff 0, extent -412.5,-12.5 -387.5,12.5
3D body: height 338.58, standoff 0, extent -512.49,-12.49 -487.49,12.51
3D body: height 98.43, standoff 11.81, extent -550,-50 -450,50
3D body: height 11.81, standoff 0, extent -550,-50 -450,-25
3D body: height 11.81, standoff 0, extent -550,25 -450,50
3D body: height 31.5, standoff 0, extent -512.5,-12.5 -487.5,12.5

## MA11-1W [mil]
pads (11):
  rect 60x60 hole 40: 1(-500,0)
  oct 60x60 hole 40: 2(-400,0) 3(-300,0) 4(-200,0) 5(-100,0) 6(0,0) 7(100,0) 8(200,0) 9(300,0) 10(400,0) 11(500,0)
Top Overlay:
  rectangle: -513,34 -487,60
  rectangle: -413,34 -387,60
  rectangle: -313,34 -287,60
  rectangle: -213,34 -187,60
  rectangle: -113,34 -87,60
  rectangle: -13,34 13,60
  rectangle: 87,34 113,60
  rectangle: 187,34 213,60
  rectangle: 287,34 313,60
  rectangle: 387,34 413,60
  rectangle: 487,34 513,60
  rectangle: -113,170 -87,200
  rectangle: -213,170 -187,200
  rectangle: -313,170 -287,200
  rectangle: -413,170 -387,200
  rectangle: -513,170 -487,200
  rectangle: 387,170 413,200
  rectangle: 287,170 313,200
  rectangle: 187,170 213,200
  rectangle: 87,170 113,200
  rectangle: -13,170 13,200
  rectangle: 487,170 513,200
  lines w6: -450,60 -350,60 ; -450,60 -550,60 -550,170 -450,170 ; -450,60 -450,170 ; -450,170 -350,170 ; -350,60 -350,170 ; -350,60 -250,60 ; -350,170 -250,170 ; -250,60 -250,170 ; -250,60 -150,60 ; -250,170 -150,170 ; -150,60 -150,170 ; -150,60 -50,60 ; -150,170 -50,170 ; -50,60 -50,170 ; -50,60 50,60 ; -50,170 50,170 ; 50,60 150,60 ; 50,60 50,170 ; 50,170 150,170 ; 150,60 150,170 ; 150,60 250,60 ; 150,170 250,170 ; 250,60 250,170 ; 250,60 350,60 ; 250,170 350,170 ; 350,60 350,170 ; 350,60 450,60 ; 350,170 450,170 ; 450,60 450,170 ; 450,60 550,60 550,170 450,170
  lines w26: -500,200 -500,385 ; -400,200 -400,385 ; -300,200 -300,385 ; -200,200 -200,385 ; -100,200 -100,385 ; 0,200 0,385 ; 100,200 100,385 ; 200,200 200,385 ; 300,200 300,385 ; 400,200 400,385 ; 500,200 500,385
3D body: height 31.5, standoff 0, extent -112.49,-12.49 -87.49,12.51
3D body: height 31.5, standoff 0, extent -212.49,-12.49 -187.49,12.51
3D body: height 31.5, standoff 0, extent -312.49,-12.49 -287.49,12.51
3D body: height 31.5, standoff 0, extent -412.49,-12.49 -387.49,12.51
3D body: height 31.5, standoff 0, extent -512.49,-12.49 -487.49,12.51
3D body: height 62.48, standoff 0, extent -512.49,-12.49 -487.49,12.51
3D body: height 100, standoff 0, extent -550,60 -450,170
3D body: height 62.5, standoff 37.5, extent -512.5,-12.49 -487.5,393.75
3D body: height 62.5, standoff 37.5, extent -412.49,-12.49 -387.49,393.76
3D body: height 100, standoff 0, extent -450,60 -350,170
3D body: height 62.48, standoff 0, extent -412.49,-12.49 -387.49,12.51
3D body: height 62.5, standoff 37.5, extent -312.49,-12.49 -287.49,393.76
3D body: height 100, standoff 0, extent -350,60 -250,170
3D body: height 62.48, standoff 0, extent -312.49,-12.49 -287.49,12.51
3D body: height 62.5, standoff 37.5, extent -212.49,-12.49 -187.49,393.76
3D body: height 100, standoff 0, extent -250,60 -150,170
3D body: height 62.48, standoff 0, extent -212.49,-12.49 -187.49,12.51
3D body: height 62.5, standoff 37.5, extent -112.49,-12.49 -87.49,393.76
3D body: height 100, standoff 0, extent -150,60 -50,170
3D body: height 62.48, standoff 0, extent -112.49,-12.49 -87.49,12.51
3D body: height 31.5, standoff 0, extent 387.51,-12.49 412.51,12.51
3D body: height 31.5, standoff 0, extent 287.51,-12.49 312.51,12.51
3D body: height 31.5, standoff 0, extent 187.51,-12.49 212.51,12.51
3D body: height 31.5, standoff 0, extent 87.51,-12.49 112.51,12.51
3D body: height 31.5, standoff 0, extent -12.49,-12.49 12.51,12.51
3D body: height 62.48, standoff 0, extent -12.49,-12.49 12.51,12.51
3D body: height 100, standoff 0, extent -50,60 50,170
3D body: height 62.5, standoff 37.5, extent -12.5,-12.49 12.5,393.75
3D body: height 62.5, standoff 37.5, extent 87.51,-12.49 112.51,393.76
3D body: height 100, standoff 0, extent 50,60 150,170
3D body: height 62.48, standoff 0, extent 87.51,-12.49 112.51,12.51
3D body: height 62.5, standoff 37.5, extent 187.51,-12.49 212.51,393.76
3D body: height 100, standoff 0, extent 150,60 250,170
3D body: height 62.48, standoff 0, extent 187.51,-12.49 212.51,12.51
3D body: height 62.5, standoff 37.5, extent 287.51,-12.49 312.51,393.76
3D body: height 100, standoff 0, extent 250,60 350,170
3D body: height 62.48, standoff 0, extent 287.51,-12.49 312.51,12.51
3D body: height 62.5, standoff 37.5, extent 387.51,-12.49 412.51,393.76
3D body: height 100, standoff 0, extent 350,60 450,170
3D body: height 62.48, standoff 0, extent 387.51,-12.49 412.51,12.51
3D body: height 31.5, standoff 0, extent 487.51,-12.49 512.51,12.51
3D body: height 62.48, standoff 0, extent 487.51,-12.49 512.51,12.51
3D body: height 100, standoff 0, extent 450,60 550,170
3D body: height 62.5, standoff 37.5, extent 487.5,-12.49 512.5,393.75

## MA11-1WL [mil]
pads (11):
  oval 60x120 hole 40: 1(-500,0) 2(-400,0) 3(-300,0) 4(-200,0) 5(-100,0) 6(0,0) 7(100,0) 8(200,0) 9(300,0) 10(400,0) 11(500,0)
Top Overlay:
  rectangle: -513,34 -487,60
  rectangle: -413,34 -387,60
  rectangle: -313,34 -287,60
  rectangle: -213,34 -187,60
  rectangle: -113,34 -87,60
  rectangle: -13,34 13,60
  rectangle: 87,34 113,60
  rectangle: 187,34 213,60
  rectangle: 287,34 313,60
  rectangle: 387,34 413,60
  rectangle: 487,34 513,60
  rectangle: -113,170 -87,200
  rectangle: -213,170 -187,200
  rectangle: -313,170 -287,200
  rectangle: -413,170 -387,200
  rectangle: -513,170 -487,200
  rectangle: 387,170 413,200
  rectangle: 287,170 313,200
  rectangle: 187,170 213,200
  rectangle: 87,170 113,200
  rectangle: -13,170 13,200
  rectangle: 487,170 513,200
  lines w6: -450,60 -350,60 ; -450,60 -550,60 -550,170 -450,170 ; -450,60 -450,170 ; -450,170 -350,170 ; -350,60 -350,170 ; -350,60 -250,60 ; -350,170 -250,170 ; -250,60 -250,170 ; -250,60 -150,60 ; -250,170 -150,170 ; -150,60 -150,170 ; -150,60 -50,60 ; -150,170 -50,170 ; -50,60 -50,170 ; -50,60 50,60 ; -50,170 50,170 ; 50,60 150,60 ; 50,60 50,170 ; 50,170 150,170 ; 150,60 150,170 ; 150,60 250,60 ; 150,170 250,170 ; 250,60 250,170 ; 250,60 350,60 ; 250,170 350,170 ; 350,60 350,170 ; 350,60 450,60 ; 350,170 450,170 ; 450,60 450,170 ; 450,60 550,60 550,170 450,170
  lines w26: -500,200 -500,385 ; -400,200 -400,385 ; -300,200 -300,385 ; -200,200 -200,385 ; -100,200 -100,385 ; 0,200 0,385 ; 100,200 100,385 ; 200,200 200,385 ; 300,200 300,385 ; 400,200 400,385 ; 500,200 500,385
3D body: height 31.5, standoff 0, extent -112.49,-12.49 -87.49,12.51
3D body: height 31.5, standoff 0, extent -212.49,-12.49 -187.49,12.51
3D body: height 31.5, standoff 0, extent -312.49,-12.49 -287.49,12.51
3D body: height 31.5, standoff 0, extent -412.49,-12.49 -387.49,12.51
3D body: height 31.5, standoff 0, extent -512.49,-12.49 -487.49,12.51
3D body: height 62.48, standoff 0, extent -512.49,-12.49 -487.49,12.51
3D body: height 100, standoff 0, extent -550,60 -450,170
3D body: height 62.5, standoff 37.5, extent -512.5,-12.49 -487.5,393.75
3D body: height 62.5, standoff 37.5, extent -412.49,-12.49 -387.49,393.76
3D body: height 100, standoff 0, extent -450,60 -350,170
3D body: height 62.48, standoff 0, extent -412.49,-12.49 -387.49,12.51
3D body: height 62.5, standoff 37.5, extent -312.49,-12.49 -287.49,393.76
3D body: height 100, standoff 0, extent -350,60 -250,170
3D body: height 62.48, standoff 0, extent -312.49,-12.49 -287.49,12.51
3D body: height 62.5, standoff 37.5, extent -212.49,-12.49 -187.49,393.76
3D body: height 100, standoff 0, extent -250,60 -150,170
3D body: height 62.48, standoff 0, extent -212.49,-12.49 -187.49,12.51
3D body: height 62.5, standoff 37.5, extent -112.49,-12.49 -87.49,393.76
3D body: height 100, standoff 0, extent -150,60 -50,170
3D body: height 62.48, standoff 0, extent -112.49,-12.49 -87.49,12.51
3D body: height 31.5, standoff 0, extent 387.51,-12.49 412.51,12.51
3D body: height 31.5, standoff 0, extent 287.51,-12.49 312.51,12.51
3D body: height 31.5, standoff 0, extent 187.51,-12.49 212.51,12.51
3D body: height 31.5, standoff 0, extent 87.51,-12.49 112.51,12.51
3D body: height 31.5, standoff 0, extent -12.49,-12.49 12.51,12.51
3D body: height 62.48, standoff 0, extent -12.49,-12.49 12.51,12.51
3D body: height 100, standoff 0, extent -50,60 50,170
3D body: height 62.5, standoff 37.5, extent -12.5,-12.49 12.5,393.75
3D body: height 62.5, standoff 37.5, extent 87.51,-12.49 112.51,393.76
3D body: height 100, standoff 0, extent 50,60 150,170
3D body: height 62.48, standoff 0, extent 87.51,-12.49 112.51,12.51
3D body: height 62.5, standoff 37.5, extent 187.51,-12.49 212.51,393.76
3D body: height 100, standoff 0, extent 150,60 250,170
3D body: height 62.48, standoff 0, extent 187.51,-12.49 212.51,12.51
3D body: height 62.5, standoff 37.5, extent 287.51,-12.49 312.51,393.76
3D body: height 100, standoff 0, extent 250,60 350,170
3D body: height 62.48, standoff 0, extent 287.51,-12.49 312.51,12.51
3D body: height 62.5, standoff 37.5, extent 387.51,-12.49 412.51,393.76
3D body: height 100, standoff 0, extent 350,60 450,170
3D body: height 62.48, standoff 0, extent 387.51,-12.49 412.51,12.51
3D body: height 31.5, standoff 0, extent 487.51,-12.49 512.51,12.51
3D body: height 62.48, standoff 0, extent 487.51,-12.49 512.51,12.51
3D body: height 100, standoff 0, extent 450,60 550,170
3D body: height 62.5, standoff 37.5, extent 487.5,-12.49 512.5,393.75

## MA11-2 [mil]
pads (22):
  rect 60x60 hole 40: 1(-500,-50)
  oct 60x60 hole 40: 2(-500,50) 3(-400,-50) 4(-400,50) 5(-300,-50) 6(-300,50) 7(-200,-50) 8(-200,50) 9(-100,-50) 10(-100,50) 11(0,-50) 12(0,50) 13(100,-50) 14(100,50) 15(200,-50) 16(200,50) 17(300,-50) 18(300,50) 19(400,-50) 20(400,50) 21(500,-50) 22(500,50)
Top Overlay:
  lines w6: -550,-75 -525,-100 -475,-100 -450,-75 -425,-100 -375,-100 -350,-75 -325,-100 -275,-100 -250,-75 -225,-100 -175,-100 -150,-75 -125,-100 -75,-100 -50,-75 -25,-100 25,-100 50,-75 75,-100 125,-100 150,-75 175,-100 225,-100 250,-75 275,-100 325,-100 350,-75 375,-100 425,-100 450,-75 475,-100 525,-100 550,-75 550,75 525,100 475,100 450,75 425,100 375,100 350,75 325,100 275,100 250,75 225,100 175,100 150,75 125,100 75,100 50,75 25,100 -25,100 -50,75 -75,100 -125,100 -150,75 -175,100 -225,100 -250,75 -275,100 -325,100 -350,75 -375,100 -425,100 -450,75 -475,100 -525,100 -550,75 -550,-75
3D body: height 31.5, standoff 0, extent 187.51,-62.49 212.51,-37.49
3D body: height 338.58, standoff 0, extent 187.51,37.51 212.51,62.51
3D body: height 98.43, standoff 11.81, extent 150,-100 250,100
3D body: height 11.81, standoff 0, extent 150,75 250,100
3D body: height 11.81, standoff 0, extent 150,-100 250,-75
3D body: height 338.58, standoff 0, extent 187.51,-62.49 212.51,-37.49
3D body: height 31.5, standoff 0, extent 187.51,37.51 212.51,62.51
3D body: height 31.5, standoff 0, extent 287.51,-62.49 312.51,-37.49
3D body: height 338.58, standoff 0, extent 287.51,37.51 312.51,62.51
3D body: height 98.43, standoff 11.81, extent 250,-100 350,100
3D body: height 11.81, standoff 0, extent 250,75 350,100
3D body: height 11.81, standoff 0, extent 250,-100 350,-75
3D body: height 338.58, standoff 0, extent 287.51,-62.49 312.51,-37.49
3D body: height 31.5, standoff 0, extent 287.51,37.51 312.51,62.51
3D body: height 31.5, standoff 0, extent 387.51,-62.49 412.51,-37.49
3D body: height 338.58, standoff 0, extent 387.51,37.51 412.51,62.51
3D body: height 98.43, standoff 11.81, extent 350,-100 450,100
3D body: height 11.81, standoff 0, extent 350,75 450,100
3D body: height 11.81, standoff 0, extent 350,-100 450,-75
3D body: height 338.58, standoff 0, extent 387.51,-62.49 412.51,-37.49
3D body: height 31.5, standoff 0, extent 387.51,37.51 412.51,62.51
3D body: height 31.5, standoff 0, extent 487.51,-62.49 512.51,-37.49
3D body: height 338.58, standoff 0, extent 487.51,37.51 512.51,62.51
3D body: height 98.43, standoff 11.81, extent 450,-100 550,100
3D body: height 11.81, standoff 0, extent 450,75 550,100
3D body: height 11.81, standoff 0, extent 450,-100 550,-75
3D body: height 338.58, standoff 0, extent 487.51,-62.49 512.51,-37.49
3D body: height 31.5, standoff 0, extent 487.51,37.51 512.51,62.51
3D body: height 31.5, standoff 0, extent 87.51,37.51 112.51,62.51
3D body: height 338.58, standoff 0, extent 87.51,-62.49 112.51,-37.49
3D body: height 11.81, standoff 0, extent 50,-100 150,-75
3D body: height 11.81, standoff 0, extent 50,75 150,100
3D body: height 98.43, standoff 11.81, extent 50,-100 150,100
3D body: height 338.58, standoff 0, extent 87.51,37.51 112.51,62.51
3D body: height 31.5, standoff 0, extent 87.51,-62.49 112.51,-37.49
3D body: height 31.5, standoff 0, extent -12.49,37.51 12.51,62.51
3D body: height 338.58, standoff 0, extent -12.49,-62.49 12.51,-37.49
3D body: height 11.81, standoff 0, extent -50,-100 50,-75
3D body: height 11.81, standoff 0, extent -50,75 50,100
3D body: height 98.43, standoff 11.81, extent -50,-100 50,100
3D body: height 338.58, standoff 0, extent -12.49,37.51 12.51,62.51
3D body: height 31.5, standoff 0, extent -12.49,-62.49 12.51,-37.49
3D body: height 31.5, standoff 0, extent -112.49,37.51 -87.49,62.51
3D body: height 338.58, standoff 0, extent -112.49,-62.49 -87.49,-37.49
3D body: height 11.81, standoff 0, extent -150,-100 -50,-75
3D body: height 11.81, standoff 0, extent -150,75 -50,100
3D body: height 98.43, standoff 11.81, extent -150,-100 -50,100
3D body: height 338.58, standoff 0, extent -112.49,37.51 -87.49,62.51
3D body: height 31.5, standoff 0, extent -112.49,-62.49 -87.49,-37.49
3D body: height 31.5, standoff 0, extent -212.49,37.51 -187.49,62.51
3D body: height 338.58, standoff 0, extent -212.49,-62.49 -187.49,-37.49
3D body: height 11.81, standoff 0, extent -250,-100 -150,-75
3D body: height 11.81, standoff 0, extent -250,75 -150,100
3D body: height 98.43, standoff 11.81, extent -250,-100 -150,100
3D body: height 338.58, standoff 0, extent -212.49,37.51 -187.49,62.51
3D body: height 31.5, standoff 0, extent -212.49,-62.49 -187.49,-37.49
3D body: height 31.5, standoff 0, extent -312.49,37.51 -287.49,62.51
3D body: height 338.58, standoff 0, extent -312.49,-62.49 -287.49,-37.49
3D body: height 11.81, standoff 0, extent -350,-100 -250,-75
3D body: height 11.81, standoff 0, extent -350,75 -250,100
3D body: height 98.43, standoff 11.81, extent -350,-100 -250,100
3D body: height 338.58, standoff 0, extent -312.49,37.51 -287.49,62.51
3D body: height 31.5, standoff 0, extent -312.49,-62.49 -287.49,-37.49
3D body: height 31.5, standoff 0, extent -412.49,37.51 -387.49,62.51
3D body: height 338.58, standoff 0, extent -412.49,-62.49 -387.49,-37.49
3D body: height 11.81, standoff 0, extent -450,-100 -350,-75
3D body: height 11.81, standoff 0, extent -450,75 -350,100
3D body: height 98.43, standoff 11.81, extent -450,-100 -350,100
3D body: height 338.58, standoff 0, extent -412.49,37.51 -387.49,62.51
3D body: height 31.5, standoff 0, extent -412.49,-62.49 -387.49,-37.49
3D body: height 31.5, standoff 0, extent -512.49,37.51 -487.49,62.51
3D body: height 338.58, standoff 0, extent -512.49,-62.49 -487.49,-37.49
3D body: height 11.81, standoff 0, extent -550,-100 -450,-75
3D body: height 11.81, standoff 0, extent -550,75 -450,100
3D body: height 98.43, standoff 11.81, extent -550,-100 -450,100
3D body: height 338.58, standoff 0, extent -512.49,37.51 -487.49,62.51
3D body: height 31.5, standoff 0, extent -512.49,-62.49 -487.49,-37.49